# Altium footprint library 6-Connectors-3.PcbLib: 153 footprints (part 3 of 11)
Each footprint in its own frame and in the unit in brackets; x right, y up, seen from the top. Pads: shape width x height; smd on the part's side, far side on the other; paste and mask are expansions set on the pad; w line width, h text height; cw(c..) or ccw(c..) is an arc to the next point about the centre after c.
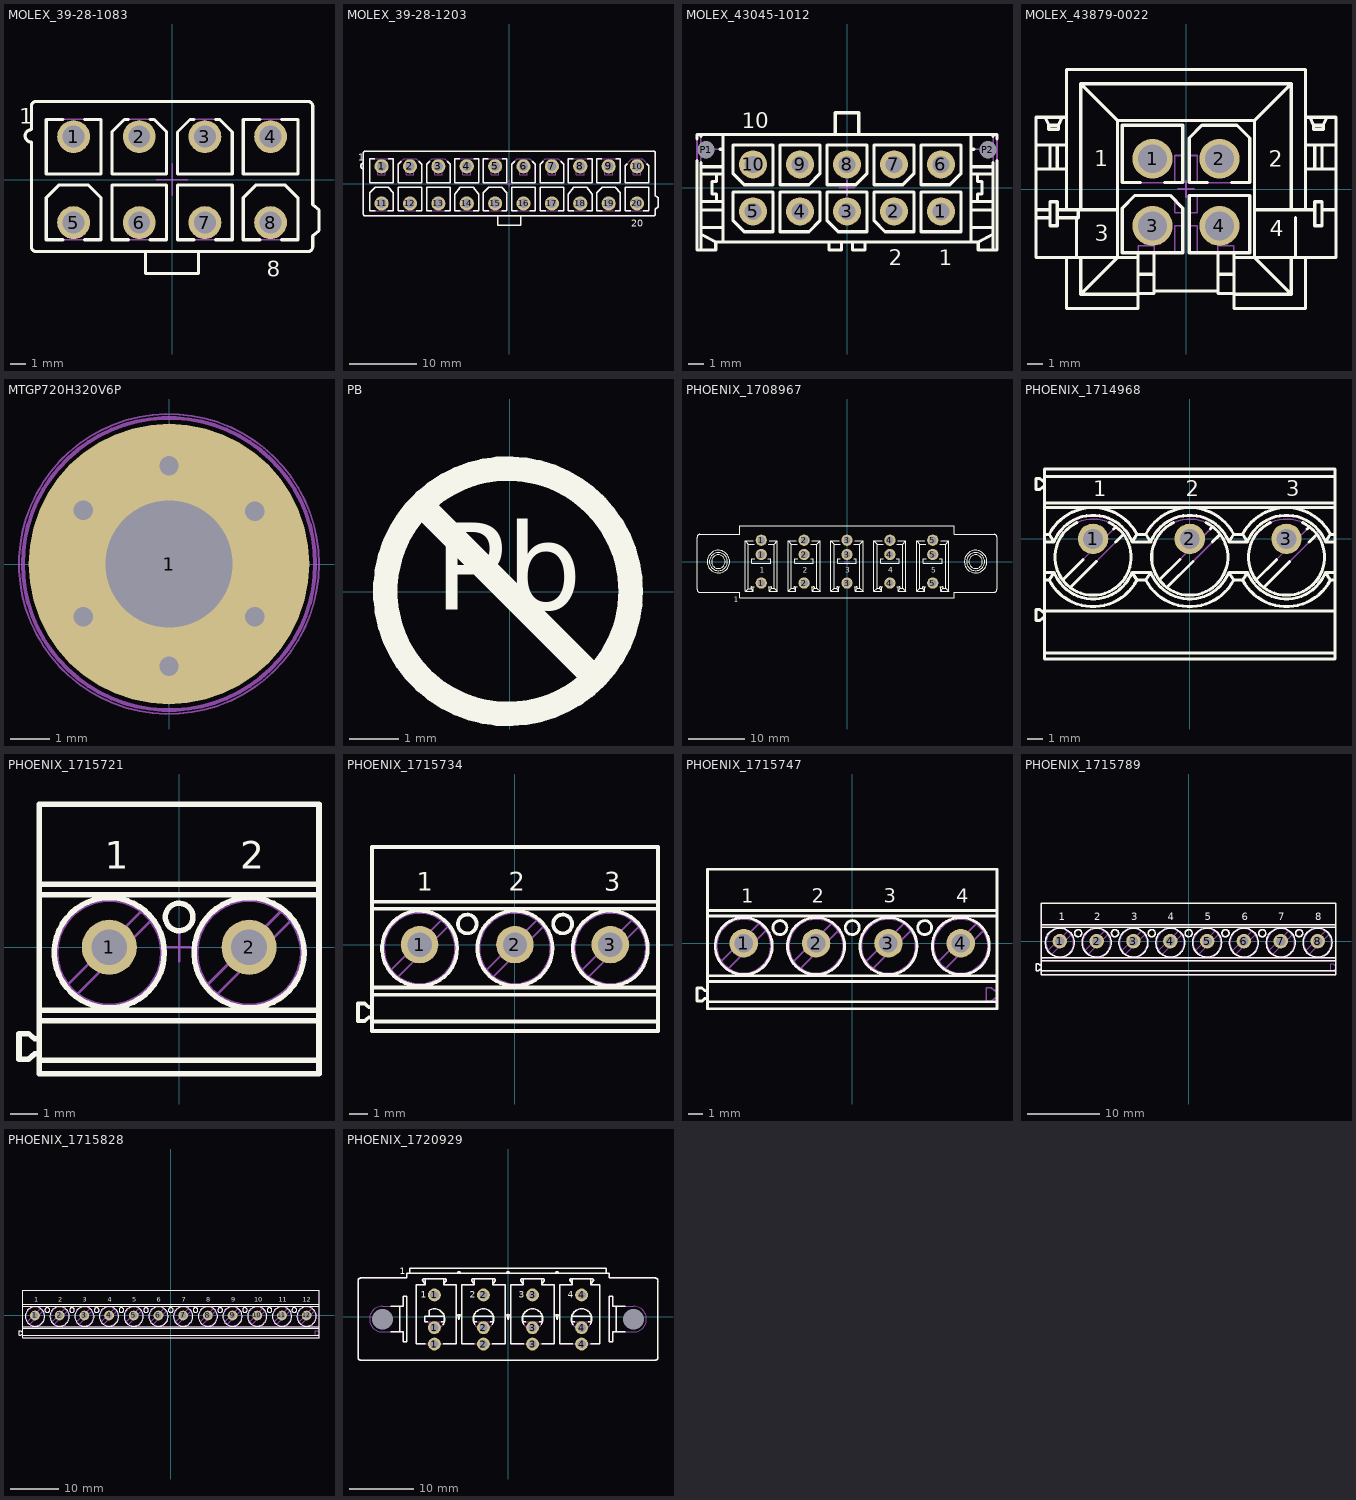
[diagram p2: the footprints below, top view; thin cyan lines are the x and y axes]

## MOLEX_39-28-1083 [mm] "4.20mm (.165\") Pitch Mini-Fit Jr. Header, Dual Row, Vertical, without Snap-in Plastic Peg PCB Lock, 8 Circuits"
height 12.8
pads (8):
  round 2.1 hole 1.4: 1(-6.3,2.75) 2(-2.1,2.75) 3(2.1,2.75) 4(6.3,2.75) 5(-6.3,-2.75) 6(-2.1,-2.75) 7(2.1,-2.75) 8(6.3,-2.75)
Top Overlay:
  lines w0.2: -6.993,-3.85 -8.05,-3.85 -8.05,-1.15 -7.25,-0.35 -5.35,-0.35 -4.55,-1.15 -4.55,-3.85 -5.607,-3.85 ; -6.993,3.85 -8.05,3.85 -8.05,0.35 -4.55,0.35 -4.55,3.85 -5.607,3.85 ; -2.793,-3.85 -3.85,-3.85 -3.85,-0.35 -0.35,-0.35 -0.35,-3.85 -1.407,-3.85 ; -2.793,3.85 -3.05,3.85 -3.85,3.05 -3.85,0.35 -0.35,0.35 -0.35,3.05 -1.15,3.85 -1.407,3.85 ; -1.7,-4.6 -1.7,-6 1.7,-6 1.7,-4.6 ; 1.407,-3.85 0.35,-3.85 0.35,-0.35 3.85,-0.35 3.85,-3.85 2.793,-3.85 ; 1.407,3.85 1.15,3.85 0.35,3.05 0.35,0.35 3.85,0.35 3.85,3.05 3.05,3.85 2.793,3.85 ; 5.607,-3.85 4.55,-3.85 4.55,-1.15 5.35,-0.35 7.25,-0.35 8.05,-1.15 8.05,-3.85 6.993,-3.85 ; 5.607,3.85 4.55,3.85 4.55,0.35 8.05,0.35 8.05,3.85 6.993,3.85 ; -9,-4.3 ccw(c-8.7,-4.3) -8.7,-4.6 8.7,-4.6 ccw(c8.7,-4.3) 9,-4.3 9,-3.6 9.4,-3.264 9.4,-1.936 9,-1.6 9,4.7 ccw(c8.7,4.7) 8.7,5 -8.7,5 ccw(c-8.7,4.7) -9,4.7 -9,3.2 ccw(c-9,2.8) -9,2.4 -9,-4.3
  text "8" at 6.067,-6.2 h1
  text "1" at -9.792,3.582 h1
Mechanical 8:
  lines w0.1: -7.3,-2.75 -6.3,-2.75 ; -7.3,2.75 -6.3,2.75 ; -6.3,-3.75 -6.3,-2.75 ; -6.3,-1.75 -6.3,-2.75 ; -6.3,1.75 -6.3,2.75 ; -6.3,3.75 -6.3,2.75 ; -5.3,-2.75 -6.3,-2.75 ; -5.3,2.75 -6.3,2.75 ; -3.1,-2.75 -2.1,-2.75 ; -3.1,2.75 -2.1,2.75 ; -2.1,-3.75 -2.1,-2.75 ; -2.1,-1.75 -2.1,-2.75 ; -2.1,1.75 -2.1,2.75 ; -2.1,3.75 -2.1,2.75 ; -1.1,-2.75 -2.1,-2.75 ; -1.1,2.75 -2.1,2.75 ; -1,0 0,0 ; 0,-1 0,0 ; 0,1 0,0 ; 1,0 0,0 ; 1.1,-2.75 2.1,-2.75 ; 1.1,2.75 2.1,2.75 ; 2.1,-3.75 2.1,-2.75 ; 2.1,-1.75 2.1,-2.75 ; 2.1,1.75 2.1,2.75 ; 2.1,3.75 2.1,2.75 ; 3.1,-2.75 2.1,-2.75 ; 3.1,2.75 2.1,2.75 ; 5.3,-2.75 6.3,-2.75 ; 5.3,2.75 6.3,2.75 ; 6.3,-3.75 6.3,-2.75 ; 6.3,-1.75 6.3,-2.75 ; 6.3,1.75 6.3,2.75 ; 6.3,3.75 6.3,2.75 ; 7.3,-2.75 6.3,-2.75 ; 7.3,2.75 6.3,2.75
Mechanical 14:
  lines w0.1: -1.7,-4.6 -1.7,-6 1.7,-6 1.7,-4.6 ; -9,-4.3 ccw(c-8.7,-4.3) -8.7,-4.6 8.7,-4.6 ccw(c8.7,-4.3) 9,-4.3 9,-3.6 9.4,-3.264 9.4,-1.936 9,-1.6 9,4.7 ccw(c8.7,4.7) 8.7,5 -8.7,5 ccw(c-8.7,4.7) -9,4.7 -9,3.2 ccw(c-9,2.8) -9,2.4 -9,-4.3 ; -8.05,-3.85 -4.55,-3.85 -4.55,-1.15 -5.35,-0.35 -7.25,-0.35 -8.05,-1.15 -8.05,-3.85 ; -8.05,0.35 -4.55,0.35 -4.55,3.85 -8.05,3.85 -8.05,0.35 ; -3.85,-3.85 -0.35,-3.85 -0.35,-0.35 -3.85,-0.35 -3.85,-3.85 ; -3.85,0.35 -0.35,0.35 -0.35,3.05 -1.15,3.85 -3.05,3.85 -3.85,3.05 -3.85,0.35 ; 0.35,-3.85 3.85,-3.85 3.85,-0.35 0.35,-0.35 0.35,-3.85 ; 0.35,0.35 3.85,0.35 3.85,3.05 3.05,3.85 1.15,3.85 0.35,3.05 0.35,0.35 ; 4.55,-3.85 8.05,-3.85 8.05,-1.15 7.25,-0.35 5.35,-0.35 4.55,-1.15 4.55,-3.85 ; 4.55,0.35 8.05,0.35 8.05,3.85 4.55,3.85 4.55,0.35
  text "8" at 6.067,-6.2 h1
  text "1" at -9.792,3.582 h1
3D body "MOLEX_39-28-1083.stp": height 12.8, standoff -3.5, extent -9.4,-6 9.4,5

## MOLEX_39-28-1203 [mm] "4.20mm (.165\") Pitch Mini-Fit Jr. Header, Dual Row, Vertical, without Snap-in Plastic Peg PCB Lock, 20 Circuits"
height 13.1
pads (20):
  round 2.1 hole 1.4: 1(-18.9,2.55) 2(-14.7,2.55) 3(-10.5,2.55) 4(-6.3,2.55) 5(-2.1,2.55) 6(2.1,2.55) 7(6.3,2.55) 8(10.5,2.55) 9(14.7,2.55) 10(18.9,2.55) 11(-18.9,-2.95) 12(-14.7,-2.95) 13(-10.5,-2.95) 14(-6.3,-2.95) 15(-2.1,-2.95) 16(2.1,-2.95) 17(6.3,-2.95) 18(10.5,-2.95) 19(14.7,-2.95) 20(18.9,-2.95)
Top Overlay:
  lines w0.2: -21.6,2.2 cw(c-21.6,2.6) -21.6,3 ; -19.92,3.65 -20.65,3.65 -20.65,0.15 -17.15,0.15 -17.15,3.65 -17.88,3.65 ; -19.845,-4.05 -20.65,-4.05 -20.65,-1.35 -19.85,-0.55 -17.95,-0.55 -17.15,-1.35 -17.15,-4.05 -17.955,-4.05 ; -15.998,3.302 -16.45,2.85 -16.45,0.15 -12.95,0.15 -12.95,2.85 -13.402,3.302 ; -15.645,-4.05 -16.45,-4.05 -16.45,-0.55 -12.95,-0.55 -12.95,-4.05 -13.755,-4.05 ; -11.798,3.302 -12.25,2.85 -12.25,0.15 -8.75,0.15 -8.75,2.85 -9.202,3.302 ; -11.445,-4.05 -12.25,-4.05 -12.25,-0.55 -8.75,-0.55 -8.75,-4.05 -9.555,-4.05 ; -7.32,3.65 -8.05,3.65 -8.05,0.15 -4.55,0.15 -4.55,3.65 -5.28,3.65 ; -7.245,-4.05 -8.05,-4.05 -8.05,-1.55 -7.25,-0.55 -5.35,-0.55 -4.55,-1.55 -4.55,-4.05 -5.355,-4.05 ; -3.12,3.65 -3.85,3.65 -3.85,0.15 -0.35,0.15 -0.35,3.65 -1.08,3.65 ; -3.045,-4.05 -3.85,-4.05 -3.85,-1.35 -3.05,-0.55 -1.15,-0.55 -0.35,-1.35 -0.35,-4.05 -1.155,-4.05 ; -1.7,-4.8 -1.7,-6.2 1.7,-6.2 1.7,-4.8 ; 0.802,3.302 0.35,2.85 0.35,0.15 3.85,0.15 3.85,2.85 3.398,3.302 ; 1.155,-4.05 0.35,-4.05 0.35,-0.55 3.85,-0.55 3.85,-4.05 3.045,-4.05 ; 5.002,3.302 4.55,2.85 4.55,0.15 8.05,0.15 8.05,2.85 7.598,3.302 ; 5.355,-4.05 4.55,-4.05 4.55,-0.55 8.05,-0.55 8.05,-4.05 7.245,-4.05 ; 9.48,3.65 8.75,3.65 8.75,0.15 12.25,0.15 12.25,3.65 11.52,3.65 ; 9.555,-4.05 8.75,-4.05 8.75,-1.55 9.55,-0.55 11.45,-0.55 12.25,-1.55 12.25,-4.05 11.445,-4.05 ; 13.68,3.65 12.95,3.65 12.95,0.15 16.45,0.15 16.45,3.65 15.72,3.65 ; 13.755,-4.05 12.95,-4.05 12.95,-1.35 13.75,-0.55 15.65,-0.55 16.45,-1.35 16.45,-4.05 15.645,-4.05 ; 17.456,2.956 17.15,2.65 17.15,0.15 20.65,0.15 20.65,2.65 20.344,2.956 ; 17.955,-4.05 17.15,-4.05 17.15,-0.55 20.65,-0.55 20.65,-4.05 19.845,-4.05 ; -21.6,-4.5 ccw(c-21.3,-4.5) -21.3,-4.8 21.3,-4.8 ccw(c21.3,-4.5) 21.6,-4.5 21.6,-3.8 22,-3.464 22,-2.136 21.6,-1.8 21.6,4.5 ccw(c21.3,4.5) 21.3,4.8 -21.3,4.8 ccw(c-21.3,4.5) -21.6,4.5 -21.6,-4.5
  text "20" at 18.033,-6.418 h1
  text "1" at -22.392,3.382 h1
Mechanical 8:
  lines w0.1: -19.4,-2.95 -18.9,-2.95 ; -19.4,2.55 -18.9,2.55 ; -18.9,-3.45 -18.9,-2.95 ; -18.9,-2.45 -18.9,-2.95 ; -18.9,2.05 -18.9,2.55 ; -18.9,3.05 -18.9,2.55 ; -18.4,-2.95 -18.9,-2.95 ; -18.4,2.55 -18.9,2.55 ; -15.2,-2.95 -14.7,-2.95 ; -15.2,2.55 -14.7,2.55 ; -14.7,-3.45 -14.7,-2.95 ; -14.7,-2.45 -14.7,-2.95 ; -14.7,2.05 -14.7,2.55 ; -14.7,3.05 -14.7,2.55 ; -14.2,-2.95 -14.7,-2.95 ; -14.2,2.55 -14.7,2.55 ; -11,-2.95 -10.5,-2.95 ; -11,2.55 -10.5,2.55 ; -10.5,-3.45 -10.5,-2.95 ; -10.5,-2.45 -10.5,-2.95 ; -10.5,2.05 -10.5,2.55 ; -10.5,3.05 -10.5,2.55 ; -10,-2.95 -10.5,-2.95 ; -10,2.55 -10.5,2.55 ; -6.8,-2.95 -6.3,-2.95 ; -6.8,2.55 -6.3,2.55 ; -6.3,-3.45 -6.3,-2.95 ; -6.3,-2.45 -6.3,-2.95 ; -6.3,2.05 -6.3,2.55 ; -6.3,3.05 -6.3,2.55 ; -5.8,-2.95 -6.3,-2.95 ; -5.8,2.55 -6.3,2.55 ; -2.6,-2.95 -2.1,-2.95 ; -2.6,2.55 -2.1,2.55 ; -2.1,-3.45 -2.1,-2.95 ; -2.1,-2.45 -2.1,-2.95 ; -2.1,2.05 -2.1,2.55 ; -2.1,3.05 -2.1,2.55 ; -1.6,-2.95 -2.1,-2.95 ; -1.6,2.55 -2.1,2.55 ; -0.5,0 0,0 ; 0,-0.5 0,0 ; 0,0.5 0,0 ; 0.5,0 0,0 ; 1.6,-2.95 2.1,-2.95 ; 1.6,2.55 2.1,2.55 ; 2.1,-3.45 2.1,-2.95 ; 2.1,-2.45 2.1,-2.95 ; 2.1,2.05 2.1,2.55 ; 2.1,3.05 2.1,2.55 ; 2.6,-2.95 2.1,-2.95 ; 2.6,2.55 2.1,2.55 ; 5.8,-2.95 6.3,-2.95 ; 5.8,2.55 6.3,2.55 ; 6.3,-3.45 6.3,-2.95 ; 6.3,-2.45 6.3,-2.95 ; 6.3,2.05 6.3,2.55 ; 6.3,3.05 6.3,2.55 ; 6.8,-2.95 6.3,-2.95 ; 6.8,2.55 6.3,2.55 ; 10,-2.95 10.5,-2.95 ; 10,2.55 10.5,2.55 ; 10.5,-3.45 10.5,-2.95 ; 10.5,-2.45 10.5,-2.95 ; 10.5,2.05 10.5,2.55 ; 10.5,3.05 10.5,2.55 ; 11,-2.95 10.5,-2.95 ; 11,2.55 10.5,2.55 ; 14.2,-2.95 14.7,-2.95 ; 14.2,2.55 14.7,2.55 ; 14.7,-3.45 14.7,-2.95 ; 14.7,-2.45 14.7,-2.95 ; 14.7,2.05 14.7,2.55 ; 14.7,3.05 14.7,2.55 ; 15.2,-2.95 14.7,-2.95 ; 15.2,2.55 14.7,2.55 ; 18.4,-2.95 18.9,-2.95 ; 18.4,2.55 18.9,2.55 ; 18.9,-3.45 18.9,-2.95 ; 18.9,-2.45 18.9,-2.95 ; 18.9,2.05 18.9,2.55 ; 18.9,3.05 18.9,2.55 ; 19.4,-2.95 18.9,-2.95 ; 19.4,2.55 18.9,2.55
Mechanical 14:
  drawing of 196 lines, arcs and shapes, not listed
  text "20" at 18.033,-6.418 h1
  text "1" at -22.392,3.382 h1
3D body "MOLEX_39-28-1203.stp": height 12.8, standoff -3.5, extent -22,-6.2 22,4.8

## MOLEX_43045-1012 [mm] "3.00mm (.118\") Pitch Micro-Fit 3.0?Header, Dual Row, Vertical, with PCB Polarizing Peg, 10 Circuits"
height 9.91
pads (12):
  round 1.8 hole 1.1: 1(6,-1.5) 2(3,-1.5) 3(0,-1.5) 4(-3,-1.5) 5(-6,-1.5) 6(6,1.5) 7(3,1.5) 8(0,1.5) 9(-3,1.5) 10(-6,1.5)
  round 1 hole 1.1 unplated mask+0.05: P1(-9,2.44) P2(9,2.44)
Top Overlay:
  lines w0.2: -9.575,1.748 -9.575,-3.97 -8.375,-3.97 -8.375,-3.46 ; -9.575,3.132 -9.575,3.4 9.575,3.4 9.575,3.132 ; -9.325,-3.97 -9.325,1.601 ; -9.325,-2.96 -8.375,-3.46 ; -9.325,-2.53 -7.925,-2.53 -7.925,-1.405 -9.325,-1.405 ; -9.325,-0.875 -7.925,-0.875 ; -9.325,0.875 -7.925,0.875 ; -9.325,1.345 -7.925,1.345 ; -9.325,3.279 -9.325,3.4 ; -8.325,-0.875 -8.325,-0.4 -8.625,-0.4 -8.625,0.4 -8.325,0.4 -8.325,0.875 ; -8.101,2.47 -7.925,2.47 ; -7.925,-3.46 -7.925,3.4 ; -1.15,-3.46 -1.15,-3.97 -0.35,-3.97 -0.35,-3.46 ; -0.75,3.4 -0.75,4.8 0.75,4.8 0.75,3.4 ; 0.35,-3.46 0.35,-3.97 1.15,-3.97 1.15,-3.46 ; 7.925,-3.46 7.925,3.4 ; 7.925,-2.53 9.325,-2.53 ; 7.925,-1.405 9.325,-1.405 ; 7.925,-0.875 9.325,-0.875 ; 7.925,0.875 9.325,0.875 ; 7.925,1.345 9.325,1.345 ; 7.925,2.47 8.101,2.47 ; 8.325,-0.875 8.325,-0.4 8.625,-0.4 8.625,0.4 8.325,0.4 8.325,0.875 ; 9.325,-3.97 9.325,1.601 ; 9.325,-2.96 8.375,-3.46 ; 9.325,3.279 9.325,3.4 ; 9.575,1.748 9.575,-3.97 8.375,-3.97 8.375,-3.46 ; -8.375,-3.46 8.375,-3.46 ; -7.27,-2.1 -6.57,-2.8 -4.73,-2.8 -4.73,-0.26 -7.27,-0.26 -7.27,-2.1 ; -7.27,0.9 -6.57,0.2 -4.73,0.2 -4.73,2.74 -7.27,2.74 -7.27,0.9 ; -4.27,-2.8 -2.43,-2.8 -1.73,-2.1 -1.73,-0.26 -4.27,-0.26 -4.27,-2.8 ; -4.27,0.2 -2.43,0.2 -1.73,0.9 -1.73,2.74 -4.27,2.74 -4.27,0.2 ; -1.27,-2.1 -0.57,-2.8 1.27,-2.8 1.27,-0.26 -1.27,-0.26 -1.27,-2.1 ; -1.27,0.2 0.57,0.2 1.27,0.9 1.27,2.74 -1.27,2.74 -1.27,0.2 ; 1.73,-2.1 2.43,-2.8 4.27,-2.8 4.27,-0.26 1.73,-0.26 1.73,-2.1 ; 1.73,0.2 3.57,0.2 4.27,0.9 4.27,2.74 1.73,2.74 1.73,0.2 ; 4.73,-2.8 7.27,-2.8 7.27,-0.26 4.73,-0.26 4.73,-2.8 ; 4.73,0.2 4.73,2.74 7.27,2.74 7.27,0.9 6.57,0.2 4.73,0.2
  text "2" at 2.667,-4.953 h1
  text "1" at 5.842,-4.953 h1
  text "10" at -6.731,3.81 h1
Mechanical 8:
  lines w0.1: -9.5,2.44 -9,2.44 ; -9,1.94 -9,2.44 ; -9,2.94 -9,2.44 ; -8.5,2.44 -9,2.44 ; -6.5,-1.5 -6,-1.5 ; -6.5,1.5 -6,1.5 ; -6,-2 -6,-1.5 ; -6,-1 -6,-1.5 ; -6,1 -6,1.5 ; -6,2 -6,1.5 ; -5.5,-1.5 -6,-1.5 ; -5.5,1.5 -6,1.5 ; -3.5,-1.5 -3,-1.5 ; -3.5,1.5 -3,1.5 ; -3,-2 -3,-1.5 ; -3,-1 -3,-1.5 ; -3,1 -3,1.5 ; -3,2 -3,1.5 ; -2.5,-1.5 -3,-1.5 ; -2.5,1.5 -3,1.5 ; -0.5,-1.5 0,-1.5 ; -0.5,0 0,0 ; -0.5,1.5 0,1.5 ; 0,-2 0,-1.5 ; 0,-1 0,-1.5 ; 0,-0.5 0,0 ; 0,0.5 0,0 ; 0,1 0,1.5 ; 0,2 0,1.5 ; 0.5,-1.5 0,-1.5 ; 0.5,0 0,0 ; 0.5,1.5 0,1.5 ; 2.5,-1.5 3,-1.5 ; 2.5,1.5 3,1.5 ; 3,-2 3,-1.5 ; 3,-1 3,-1.5 ; 3,1 3,1.5 ; 3,2 3,1.5 ; 3.5,-1.5 3,-1.5 ; 3.5,1.5 3,1.5 ; 5.5,-1.5 6,-1.5 ; 5.5,1.5 6,1.5 ; 6,-2 6,-1.5 ; 6,-1 6,-1.5 ; 6,1 6,1.5 ; 6,2 6,1.5 ; 6.5,-1.5 6,-1.5 ; 6.5,1.5 6,1.5 ; 8.5,2.44 9,2.44 ; 9,1.94 9,2.44 ; 9,2.94 9,2.44 ; 9.5,2.44 9,2.44
Mechanical 14:
  lines w0.1: -9.325,-3.97 -9.325,3.4 ; -9.325,-2.96 -8.375,-3.46 ; -9.325,-2.53 -7.925,-2.53 -7.925,-1.405 -9.325,-1.405 ; -9.325,-0.875 -7.925,-0.875 ; -9.325,0.875 -7.925,0.875 ; -9.325,1.345 -7.925,1.345 ; -9.325,2.47 -7.925,2.47 ; -8.325,-0.875 -8.325,-0.4 -8.625,-0.4 -8.625,0.4 -8.325,0.4 -8.325,0.875 ; -7.925,-3.46 -7.925,3.4 ; -1.15,-3.46 -1.15,-3.97 -0.35,-3.97 -0.35,-3.46 ; -0.75,3.4 -0.75,4.8 0.75,4.8 0.75,3.4 ; 0.35,-3.46 0.35,-3.97 1.15,-3.97 1.15,-3.46 ; 7.925,-3.46 7.925,3.4 ; 7.925,-2.53 9.325,-2.53 ; 7.925,-1.405 9.325,-1.405 ; 7.925,-0.875 9.325,-0.875 ; 7.925,0.875 9.325,0.875 ; 7.925,1.345 9.325,1.345 ; 7.925,2.47 9.325,2.47 ; 8.325,-0.875 8.325,-0.4 8.625,-0.4 8.625,0.4 8.325,0.4 8.325,0.875 ; 9.325,-3.97 9.325,3.4 ; 9.325,-2.96 8.375,-3.46 ; -8.375,-3.46 -8.375,-3.97 -9.575,-3.97 -9.575,3.4 9.575,3.4 9.575,-3.97 8.375,-3.97 8.375,-3.46 ; -8.375,-3.46 8.375,-3.46 ; -7.27,-2.1 -7.27,-0.26 -4.73,-0.26 -4.73,-2.8 -6.57,-2.8 -7.27,-2.1 ; -7.27,0.9 -7.27,2.74 -4.73,2.74 -4.73,0.2 -6.57,0.2 -7.27,0.9 ; -4.27,-2.8 -4.27,-0.26 -1.73,-0.26 -1.73,-2.1 -2.43,-2.8 -4.27,-2.8 ; -4.27,0.2 -4.27,2.74 -1.73,2.74 -1.73,0.9 -2.43,0.2 -4.27,0.2 ; -1.27,-2.1 -1.27,-0.26 1.27,-0.26 1.27,-2.8 -0.57,-2.8 -1.27,-2.1 ; -1.27,0.2 -1.27,2.74 1.27,2.74 1.27,0.9 0.57,0.2 -1.27,0.2 ; 1.73,-2.1 1.73,-0.26 4.27,-0.26 4.27,-2.8 2.43,-2.8 1.73,-2.1 ; 1.73,0.2 1.73,2.74 4.27,2.74 4.27,0.9 3.57,0.2 1.73,0.2 ; 4.73,-2.8 4.73,-0.26 7.27,-0.26 7.27,-2.8 4.73,-2.8 ; 4.73,0.2 6.57,0.2 7.27,0.9 7.27,2.74 4.73,2.74 4.73,0.2
  text "2" at 2.667,-4.953 h1
  text "10" at -6.731,3.81 h1
  text "1" at 5.842,-4.953 h1
3D body "MOLEX_43045-1012.stp": height 9.91, standoff -3.18, extent -9.575,-3.97 9.575,4.8

## MOLEX_43879-0022 [mm] "4.20mm Pitch, Mini-Fit?CPI (Compliant Pin Interface) 4 Circuits Dual Row Vertical Header"
height 14.9
pads (4):
  round 2.5 hole 1.8: 1(-2.1,1.9) 2(2.1,1.9) 3(-2.1,-2.314) 4(2.1,-2.314)
Top Overlay:
  lines w0.2: -9.405,-1.8 -8.525,-1.8 ; -9.405,-1.3 -8.525,-1.3 ; -9.405,1.25 -7.5,1.25 ; -9.405,2.75 -7.5,2.75 ; -8.833,4.5 -8.6,4.001 ; -8.525,1.25 -8.525,2.75 ; -8.075,-1.8 -6.755,-1.8 -6.755,-1.3 ; -8.075,-1.3 -4.3,-1.3 ; -8.075,1.25 -8.075,2.75 ; -7.767,4.5 -8,4.001 ; -7.5,-4.3 -7.5,-7.5 -3,-7.5 -3,-4 ; -7.5,-1.3 -7.5,7.5 7.5,7.5 7.5,-1.3 ; -7.5,4.5 -9.405,4.5 -9.405,-4.3 -3,-4.3 ; -6.86,-4.3 -6.86,-1.8 ; -6.6,-4.3 -6.6,-6.6 ; -6.6,-1.3 -6.6,6.6 ; -3,-6.6 -6.6,-6.6 ; -3,-6.55 -2,-6.55 -2,-4 ; -3,-5.35 -2,-5.35 ; -2.845,0.4 -4,0.4 -4,4 -0.2,4 -0.2,0.4 -1.355,0.4 ; -2,-6.4 2,-6.4 ; 1.355,0.4 0.2,0.4 0.2,3.2 1,4 3.2,4 4,3.2 4,0.4 2.845,0.4 ; 2,-5.35 3,-5.35 ; 2,-3.986 2,-6.55 3,-6.55 ; 3,-6.6 6.6,-6.6 ; 3,-4.3 9.405,-4.3 9.405,4.5 7.5,4.5 ; 3,-4 3,-7.5 7.5,-7.5 7.5,-4.3 ; 4.3,-1.3 8.075,-1.3 ; 6.6,-4.3 6.6,-6.6 ; 6.6,-1.3 6.6,6.6 ; 6.86,-4.3 6.86,-1.8 ; 7.5,1.25 9.405,1.25 ; 7.5,2.75 9.405,2.75 ; 7.767,4.5 8,4.001 ; 8.075,1.25 8.075,2.75 ; 8.525,-1.3 9.405,-1.3 ; 8.525,1.25 8.525,2.75 ; 8.833,4.5 8.6,4 ; -8.6,4.001 -8,4.001 ; -8.6,4.001 -8.6,3.75 -8,3.75 -8,4.001 ; -6.6,-6.6 -4.3,-4.3 -4.3,4.3 ; -6.6,6.6 -4.3,4.3 ; -6.6,6.6 6.6,6.6 ; -4.3,4.3 4.3,4.3 ; 4.3,4.3 6.6,6.6 ; 4.3,4.3 4.3,-4.3 6.6,-6.6 ; 8,4.001 8.6,4 ; 8,4.001 8,3.75 8.6,3.75 8.6,4.001 ; -8.525,-2.3 -8.075,-2.3 -8.075,-0.8 -8.525,-0.8 -8.525,-2.3 ; -4,-4 -4,-1.2 -3.2,-0.4 -1,-0.4 -0.2,-1.2 -0.2,-4 -4,-4 ; 0.2,-4 4,-4 4,-0.4 0.2,-0.4 0.2,-4 ; 8.075,-2.3 8.525,-2.3 8.525,-0.8 8.075,-0.8 8.075,-2.3
  text "3" at -5.733,-3.289 h1
  text "2" at 5.192,1.386 h1
  text "4" at 5.242,-2.975 h1
  text "1" at -5.767,1.432 h1
Mechanical 8:
  lines w0.1: -2.6,-2.314 -2.1,-2.314 ; -2.6,1.9 -2.1,1.9 ; -2.1,-2.814 -2.1,-2.314 ; -2.1,-1.814 -2.1,-2.314 ; -2.1,1.4 -2.1,1.9 ; -2.1,2.4 -2.1,1.9 ; -1.6,-2.314 -2.1,-2.314 ; -1.6,1.9 -2.1,1.9 ; -0.5,0 0,0 ; 0,-0.5 0,0 ; 0,0.5 0,0 ; 0.5,0 0,0 ; 1.6,-2.314 2.1,-2.314 ; 1.6,1.9 2.1,1.9 ; 2.1,-2.814 2.1,-2.314 ; 2.1,-1.814 2.1,-2.314 ; 2.1,1.4 2.1,1.9 ; 2.1,2.4 2.1,1.9 ; 2.6,-2.314 2.1,-2.314 ; 2.6,1.9 2.1,1.9
Mechanical 14:
  lines w0.1: -9.405,-1.8 -8.525,-1.8 ; -9.405,-1.3 -8.525,-1.3 ; -9.405,1.25 -7.5,1.25 ; -9.405,2.75 -7.5,2.75 ; -8.833,4.5 -8.6,4.001 ; -8.525,1.25 -8.525,2.75 ; -8.075,-1.8 -6.755,-1.8 -6.755,-1.3 ; -8.075,-1.3 -4.3,-1.3 ; -8.075,1.25 -8.075,2.75 ; -7.767,4.5 -8,4.001 ; -7.5,-4.3 -7.5,-7.5 -3,-7.5 -3,-3.55 -2,-3.55 -2,-6.55 -3,-6.55 ; -7.5,-1.3 -7.5,7.5 7.5,7.5 7.5,-1.3 ; -7.5,4.5 -9.405,4.5 -9.405,-4.3 -3,-4.3 ; -6.86,-4.3 -6.86,-1.8 ; -6.6,-4.3 -6.6,-6.6 ; -6.6,-1.3 -6.6,6.6 ; -3,-6.6 -6.6,-6.6 ; -3,-5.35 -2,-5.35 ; -2,-6.4 2,-6.4 ; -0.7,-4 -0.7,-2.3 -0.2,-2.3 ; -0.7,-0.7 -0.7,-1.5 -0.2,-1.5 ; -0.7,0.4 -0.7,2.1 -0.2,2.1 ; 0.2,-3.96 0.7,-3.96 0.7,-2.3 0.2,-2.3 ; 0.2,-1.5 0.7,-1.5 0.7,-0.4 ; 0.2,2.1 0.7,2.1 0.7,0.4 ; 2,-5.35 3,-5.35 ; 3,-6.6 6.6,-6.6 ; 3,-6.55 2,-6.55 2,-3.55 3,-3.55 3,-7.5 7.5,-7.5 7.5,-4.3 ; 3,-4.3 9.405,-4.3 9.405,4.5 7.5,4.5 ; 4.3,-1.3 8.075,-1.3 ; 6.6,-4.3 6.6,-6.6 ; 6.6,-1.3 6.6,6.6 ; 6.86,-4.3 6.86,-1.8 ; 7.5,1.25 9.405,1.25 ; 7.5,2.75 9.405,2.75 ; 7.767,4.5 8,4.001 ; 8.075,1.25 8.075,2.75 ; 8.525,-1.3 9.405,-1.3 ; 8.525,1.25 8.525,2.75 ; 8.833,4.5 8.6,4 ; -8.6,4.001 -8,4.001 ; -8.6,4.001 -8.6,3.75 -8,3.75 -8,4.001 ; -6.6,-6.6 -4.3,-4.3 -4.3,4.3 ; -6.6,6.6 -4.3,4.3 ; -6.6,6.6 6.6,6.6 ; -4.3,4.3 4.3,4.3 ; 4.3,4.3 6.6,6.6 ; 4.3,4.3 4.3,-4.3 6.6,-6.6 ; 8,4.001 8.6,4 ; 8,4.001 8,3.75 8.6,3.75 8.6,4.001 ; -8.525,-2.3 -8.075,-2.3 -8.075,-0.8 -8.525,-0.8 -8.525,-2.3 ; -4,-4 -4,-1.2 -3.2,-0.4 -1,-0.4 -0.2,-1.2 -0.2,-4 -4,-4 ; -4,0.4 -0.2,0.4 -0.2,4 -4,4 -4,0.4 ; -2.475,-2.675 -1.725,-2.675 -1.725,-1.925 -2.475,-1.925 -2.475,-2.675 ; -2.475,1.525 -1.725,1.525 -1.725,2.275 -2.475,2.275 -2.475,1.525 ; 0.2,-4 4,-4 4,-0.4 0.2,-0.4 0.2,-4 ; 0.2,0.4 0.2,3.2 1,4 3.2,4 4,3.2 4,0.4 0.2,0.4 ; 1.725,-2.675 2.475,-2.675 2.475,-1.925 1.725,-1.925 1.725,-2.675 ; 1.725,1.525 2.475,1.525 2.475,2.275 1.725,2.275 1.725,1.525 ; 8.075,-2.3 8.525,-2.3 8.525,-0.8 8.075,-0.8 8.075,-2.3
  text "3" at -5.733,-3.289 h1
  text "2" at 5.192,1.386 h1
  text "4" at 5.242,-2.975 h1
  text "1" at -5.767,1.432 h1
Drill Drawing:
  lines w0.1: -4,-4 -4,4 4,4 4,-4 -4,-4
  text "diam. 1.8mm +0.1 -0.05" at -8.9,4.4 h1
  text "PRESS-FIT TECHNOLOGY" at -8.275,6.075 h1
3D body "MOLEX_43879-0022.stp": height 14.9, standoff -5.82, extent -9.405,-7.5 9.405,7.5

## MTGP720H320V6P [mm]
pads (1):
  round 7.2 hole 3.25: 1(0,0)
via -2.2,-1.35 diameter 1 hole 0.5
via -2.2,1.375 diameter 1 hole 0.5
via 0,2.525 diameter 1 hole 0.5
via 2.2,1.35 diameter 1 hole 0.5
via 0,-2.625 diameter 1 hole 0.5
via 2.2,-1.35 diameter 1 hole 0.5
Mechanical 8:
  circle w0.1: c0,0 r2.6
  circle w0.1: c0,0 r3.75
  lines w0.1: -2.657,1.625 -2.224,1.375 ; -2.632,-1.6 -2.199,-1.35 ; -2.474,0.942 -2.224,1.375 ; -2.449,-0.917 -2.199,-1.35 ; -1.974,1.808 -2.224,1.375 ; -1.949,-1.783 -2.199,-1.35 ; -1.791,1.125 -2.224,1.375 ; -1.766,-1.1 -2.199,-1.35 ; -0.5,-2.625 0,-2.625 ; -0.5,0 0,0 ; -0.5,2.525 0,2.525 ; 0,-3.125 0,-2.625 ; 0,-2.125 0,-2.625 ; 0,-0.5 0,0 ; 0,0.5 0,0 ; 0,2.025 0,2.525 ; 0,3.025 0,2.525 ; 0.5,-2.625 0,-2.625 ; 0.5,0 0,0 ; 0.5,2.525 0,2.525 ; 1.766,-1.1 2.199,-1.35 ; 1.766,1.1 2.199,1.35 ; 1.949,-1.783 2.199,-1.35 ; 1.949,1.783 2.199,1.35 ; 2.449,-0.917 2.199,-1.35 ; 2.449,0.917 2.199,1.35 ; 2.632,-1.6 2.199,-1.35 ; 2.632,1.6 2.199,1.35
Mechanical 14:
  circle w0.1: c0,0 r3.75
Mechanical 15:
  circle w0.05: c0,0 r3.85
3D body "mtgp720h320v6p.stp": height 0.1, standoff -1.75, extent -3.627,-3.627 3.628,3.628

## PB [mm]
Top Overlay:
  circle w0.5: c-0.031,0.013 r2.5
  lines w0.5: -1.737,1.719 1.675,-1.693
  text "Pb" at -1.536,-0.948 h3.05
3D body "pb.stp": height 0.02, standoff 0, extent -2.725,-2.725 2.725,2.725

## PHOENIX_1708967 [mm] "PCB Header, 41A, 630V, Pitch: 7.62mm, 5 Positions, IPCV Serie"
height 30.1
pads (15):
  round 2 hole 1.3: 1(-15.24,-3.82) 1(-15.24,1.26) 1(-15.24,3.8) 2(-7.62,-3.82) 2(-7.62,1.26) 2(-7.62,3.8) 3(0,-3.82) 3(0,1.26) 3(0,3.8) 4(7.62,-3.82) 4(7.62,1.26) 4(7.62,3.8) 5(15.24,-3.82) 5(15.24,1.26) 5(15.24,3.8)
Top Overlay:
  drawing of 187 lines, arcs and shapes, not listed
  text "1" at -15.525,-2.025 h1
  text "2" at -7.905,-2.025 h1
  text "3" at -0.285,-2.025 h1
  text "4" at 7.335,-2.025 h1
  text "5" at 14.955,-1.97 h1
  text "1" at -20.11,-7.255 h1
Mechanical 8:
  lines w0.1: -15.74,-3.82 -15.24,-3.82 ; -15.74,1.26 -15.24,1.26 ; -15.74,3.8 -15.24,3.8 ; -15.24,-4.32 -15.24,-3.82 ; -15.24,-3.32 -15.24,-3.82 ; -15.24,0.76 -15.24,1.26 ; -15.24,1.76 -15.24,1.26 ; -15.24,3.3 -15.24,3.8 ; -15.24,4.3 -15.24,3.8 ; -14.74,-3.82 -15.24,-3.82 ; -14.74,1.26 -15.24,1.26 ; -14.74,3.8 -15.24,3.8 ; -8.12,-3.82 -7.62,-3.82 ; -8.12,1.26 -7.62,1.26 ; -8.12,3.8 -7.62,3.8 ; -7.62,-4.32 -7.62,-3.82 ; -7.62,-3.32 -7.62,-3.82 ; -7.62,0.76 -7.62,1.26 ; -7.62,1.76 -7.62,1.26 ; -7.62,3.3 -7.62,3.8 ; -7.62,4.3 -7.62,3.8 ; -7.12,-3.82 -7.62,-3.82 ; -7.12,1.26 -7.62,1.26 ; -7.12,3.8 -7.62,3.8 ; -0.5,-3.82 0,-3.82 ; -0.5,0 0,0 ; -0.5,1.26 0,1.26 ; -0.5,3.8 0,3.8 ; 0,-4.32 0,-3.82 ; 0,-3.32 0,-3.82 ; 0,-0.5 0,0 ; 0,0.5 0,0 ; 0,0.76 0,1.26 ; 0,1.76 0,1.26 ; 0,3.3 0,3.8 ; 0,4.3 0,3.8 ; 0.5,-3.82 0,-3.82 ; 0.5,0 0,0 ; 0.5,1.26 0,1.26 ; 0.5,3.8 0,3.8 ; 7.12,-3.82 7.62,-3.82 ; 7.12,1.26 7.62,1.26 ; 7.12,3.8 7.62,3.8 ; 7.62,-4.32 7.62,-3.82 ; 7.62,-3.32 7.62,-3.82 ; 7.62,0.76 7.62,1.26 ; 7.62,1.76 7.62,1.26 ; 7.62,3.3 7.62,3.8 ; 7.62,4.3 7.62,3.8 ; 8.12,-3.82 7.62,-3.82 ; 8.12,1.26 7.62,1.26 ; 8.12,3.8 7.62,3.8 ; 14.74,-3.82 15.24,-3.82 ; 14.74,1.26 15.24,1.26 ; 14.74,3.8 15.24,3.8 ; 15.24,-4.32 15.24,-3.82 ; 15.24,-3.32 15.24,-3.82 ; 15.24,0.76 15.24,1.26 ; 15.24,1.76 15.24,1.26 ; 15.24,3.3 15.24,3.8 ; 15.24,4.3 15.24,3.8 ; 15.74,-3.82 15.24,-3.82 ; 15.74,1.26 15.24,1.26 ; 15.74,3.8 15.24,3.8
Mechanical 14:
  text "1" at -15.525,-2.025 h1
  text "2" at -7.905,-2.025 h1
  text "3" at -0.285,-2.025 h1
  text "4" at 7.335,-2.025 h1
  text "5" at 14.955,-1.97 h1
  text "1" at -20.11,-7.255 h1
3D body "PHOENIX_1708967.stp": height 30.1, standoff -5, extent -26.66,-6.4 26.66,6.4
